# Altium footprint library COMATEL THD.PcbLib: 70 footprints (part 5 of 5)
Each footprint in its own frame and in the unit in brackets; x right, y up, seen from the top. Pads: shape width x height; smd on the part's side, far side on the other; paste and mask are expansions set on the pad; w line width, h text height; cw(c..) or ccw(c..) is an arc to the next point about the centre after c.
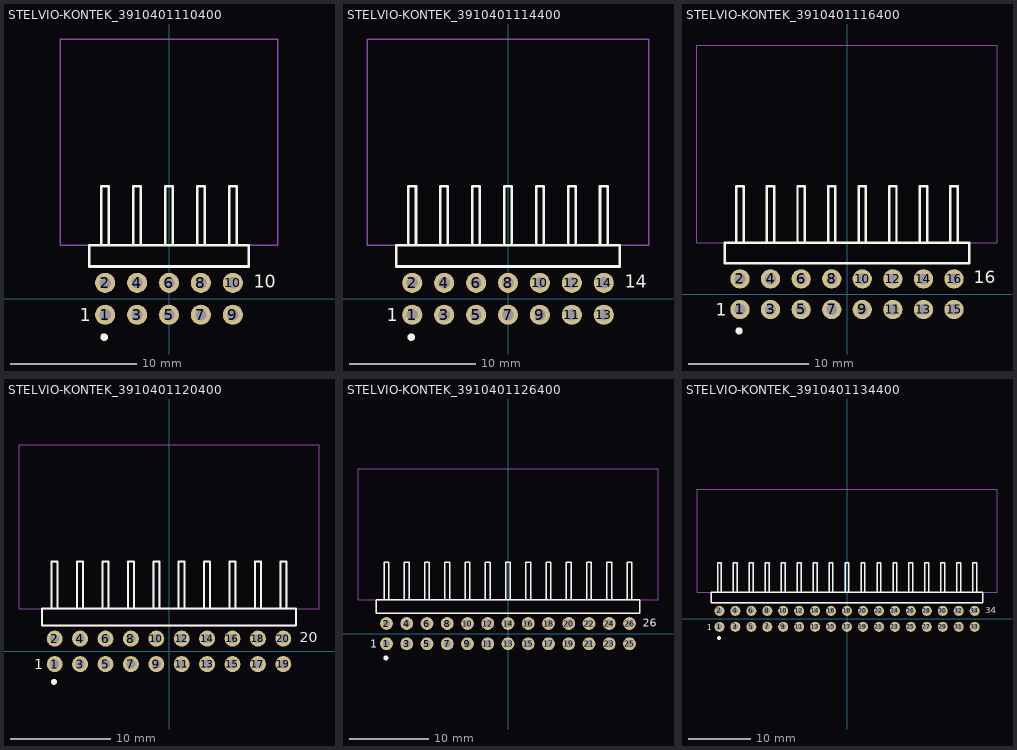
[diagram p4: the footprints below, top view; thin cyan lines are the x and y axes]

## STELVIO-KONTEK_3910401110400 [mm] "10 Contacts - Pitch 2.54mm - Dual Row Right Angle Strip Header - Insulator 1.7mm"
height 5.7
pads (10):
  round 1.6 hole 0.9: 1(-5.08,-1.27) 2(-5.08,1.27) 3(-2.54,-1.27) 4(-2.54,1.27) 5(0,-1.27) 6(0,1.27) 7(2.54,-1.27) 8(2.54,1.27) 9(5.08,-1.27) 10(5.08,1.27)
Top Overlay:
  circle w0.3: c-5.153,-3.048 r0.15
  lines w0.2: -6.35,2.57 6.35,2.57 6.35,4.27 -6.35,4.27 -6.35,2.57 ; -5.38,4.27 -5.38,8.97 -4.78,8.97 -4.78,4.27 -5.38,4.27 ; -2.84,4.27 -2.24,4.27 -2.24,8.97 -2.84,8.97 -2.84,4.27 ; -0.3,4.27 0.3,4.27 0.3,8.97 -0.3,8.97 -0.3,4.27 ; 2.24,4.27 2.84,4.27 2.84,8.97 2.24,8.97 2.24,4.27 ; 4.78,4.27 5.38,4.27 5.38,8.97 4.78,8.97 4.78,4.27
  text "1" at -7.112,-1.778 h1.02
  text "10" at 6.731,0.889 h1.02
Mechanical 8:
  lines w0.1: -8.65,4.27 -8.65,20.67 8.65,20.67 8.65,4.27 -8.65,4.27
Mechanical 14:
  lines w0.1: -6.35,2.57 -6.35,4.27 6.35,4.27 6.35,2.57 -6.35,2.57 ; -5.38,4.27 -5.38,8.97 -4.78,8.97 -4.78,4.27 -5.38,4.27 ; -2.84,4.27 -2.24,4.27 -2.24,8.97 -2.84,8.97 -2.84,4.27 ; -0.3,4.27 0.3,4.27 0.3,8.97 -0.3,8.97 -0.3,4.27 ; 2.24,4.27 2.84,4.27 2.84,8.97 2.24,8.97 2.24,4.27 ; 4.78,4.27 5.38,4.27 5.38,8.97 4.78,8.97 4.78,4.27
  text "1" at -7.112,-1.778 h1.02
  text "10" at 6.731,0.889 h1.02
3D body "STELVIO-KONTEK_3910401110400.stp": height 5.57, standoff -4.3, extent -6.35,-1.57 6.35,10.27

## STELVIO-KONTEK_3910401114400 [mm] "14 Contacts - Pitch 2.54mm - Dual Row Right Angle Strip Header - Insulator 1.7mm"
height 5.7
pads (14):
  round 1.6 hole 0.9: 1(-7.62,-1.27) 2(-7.62,1.27) 3(-5.08,-1.27) 4(-5.08,1.27) 5(-2.54,-1.27) 6(-2.54,1.27) 7(0,-1.27) 8(0,1.27) 9(2.54,-1.27) 10(2.54,1.27) 11(5.08,-1.27) 12(5.08,1.27) 13(7.62,-1.27) 14(7.62,1.27)
Top Overlay:
  circle w0.3: c-7.693,-3.048 r0.15
  lines w0.2: -7.92,4.27 -7.32,4.27 ; -7.92,4.27 -7.92,8.97 -7.32,8.97 -7.32,4.27 ; -7.92,4.27 -7.32,4.27 ; -5.38,4.27 -4.78,4.27 ; -5.38,4.27 -5.38,8.97 -4.78,8.97 -4.78,4.27 ; -5.38,4.27 -4.78,4.27 ; -2.84,4.27 -2.24,4.27 ; -2.84,4.27 -2.84,8.97 -2.24,8.97 -2.24,4.27 ; -2.84,4.27 -2.24,4.27 ; -0.3,4.27 0.3,4.27 ; -0.3,4.27 -0.3,8.97 0.3,8.97 0.3,4.27 ; -0.3,4.27 0.3,4.27 ; 2.24,4.27 2.84,4.27 ; 2.24,4.27 2.24,8.97 2.84,8.97 2.84,4.27 ; 2.24,4.27 2.84,4.27 ; -8.89,2.57 -8.89,4.27 8.89,4.27 8.89,2.57 -8.89,2.57 ; 4.78,4.27 5.38,4.27 5.38,8.97 4.78,8.97 4.78,4.27 ; 7.32,4.27 7.92,4.27 7.92,8.97 7.32,8.97 7.32,4.27
  text "14" at 9.271,0.889 h1.02
  text "1" at -9.652,-1.778 h1.02
Mechanical 8:
  lines w0.1: -11.19,4.27 11.19,4.27 11.19,20.67 -11.19,20.67 -11.19,4.27
Mechanical 14:
  lines w0.1: -7.92,4.27 -7.32,4.27 ; -7.92,4.27 -7.92,8.97 -7.32,8.97 -7.32,4.27 ; -7.92,4.27 -7.32,4.27 ; -5.38,4.27 -4.78,4.27 ; -5.38,4.27 -5.38,8.97 -4.78,8.97 -4.78,4.27 ; -5.38,4.27 -4.78,4.27 ; -2.84,4.27 -2.24,4.27 ; -2.84,4.27 -2.84,8.97 -2.24,8.97 -2.24,4.27 ; -2.84,4.27 -2.24,4.27 ; -0.3,4.27 0.3,4.27 ; -0.3,4.27 -0.3,8.97 0.3,8.97 0.3,4.27 ; -0.3,4.27 0.3,4.27 ; 2.24,4.27 2.84,4.27 ; 2.24,4.27 2.24,8.97 2.84,8.97 2.84,4.27 ; 2.24,4.27 2.84,4.27 ; -8.89,2.57 8.89,2.57 8.89,4.27 -8.89,4.27 -8.89,2.57 ; 4.78,4.27 5.38,4.27 5.38,8.97 4.78,8.97 4.78,4.27 ; 7.32,4.27 7.92,4.27 7.92,8.97 7.32,8.97 7.32,4.27
  text "14" at 9.271,0.889 h1.02
  text "1" at -9.652,-1.778 h1.02
3D body "STELVIO-KONTEK_3910401114400.stp": height 5.57, standoff -4.3, extent -8.89,-1.57 8.89,10.27

## STELVIO-KONTEK_3910401116400 [mm] "16 Contacts - Pitch 2.54mm - Dual Row Right Angle Strip Header - Insulator 1.7mm"
height 5.7
pads (16):
  round 1.6 hole 0.9: 1(-8.89,-1.27) 2(-8.89,1.27) 3(-6.35,-1.27) 4(-6.35,1.27) 5(-3.81,-1.27) 6(-3.81,1.27) 7(-1.27,-1.27) 8(-1.27,1.27) 9(1.27,-1.27) 10(1.27,1.27) 11(3.81,-1.27) 12(3.81,1.27) 13(6.35,-1.27) 14(6.35,1.27) 15(8.89,-1.27) 16(8.89,1.27)
Top Overlay:
  circle w0.3: c-8.963,-3.048 r0.15
  lines w0.2: -9.19,4.27 -8.59,4.27 ; -9.19,4.27 -9.19,8.97 -8.59,8.97 -8.59,4.27 ; -9.19,4.27 -8.59,4.27 ; -6.65,4.27 -6.05,4.27 ; -6.65,4.27 -6.65,8.97 -6.05,8.97 -6.05,4.27 ; -6.65,4.27 -6.05,4.27 ; -4.11,4.27 -3.51,4.27 ; -4.11,4.27 -4.11,8.97 -3.51,8.97 -3.51,4.27 ; -4.11,4.27 -3.51,4.27 ; -1.57,4.27 -0.97,4.27 ; -1.57,4.27 -1.57,8.97 -0.97,8.97 -0.97,4.27 ; -1.57,4.27 -0.97,4.27 ; 0.97,4.27 1.57,4.27 ; 0.97,4.27 0.97,8.97 1.57,8.97 1.57,4.27 ; 0.97,4.27 1.57,4.27 ; -10.16,2.57 -10.16,4.27 10.16,4.27 10.16,2.57 -10.16,2.57 ; 3.51,4.27 4.11,4.27 4.11,8.97 3.51,8.97 3.51,4.27 ; 6.05,4.27 6.65,4.27 6.65,8.97 6.05,8.97 6.05,4.27 ; 8.59,4.27 8.59,8.97 9.19,8.97 9.19,4.27 8.59,4.27
  text "16" at 10.541,0.889 h1.02
  text "1" at -10.922,-1.778 h1.02
Mechanical 8:
  lines w0.1: -12.46,4.27 -12.46,20.67 12.46,20.67 12.46,4.27 -12.46,4.27
Mechanical 14:
  lines w0.1: -9.19,4.27 -8.59,4.27 ; -9.19,4.27 -9.19,8.97 -8.59,8.97 -8.59,4.27 ; -9.19,4.27 -8.59,4.27 ; -6.65,4.27 -6.05,4.27 ; -6.65,4.27 -6.65,8.97 -6.05,8.97 -6.05,4.27 ; -6.65,4.27 -6.05,4.27 ; -4.11,4.27 -3.51,4.27 ; -4.11,4.27 -4.11,8.97 -3.51,8.97 -3.51,4.27 ; -4.11,4.27 -3.51,4.27 ; -1.57,4.27 -0.97,4.27 ; -1.57,4.27 -1.57,8.97 -0.97,8.97 -0.97,4.27 ; -1.57,4.27 -0.97,4.27 ; 0.97,4.27 1.57,4.27 ; 0.97,4.27 0.97,8.97 1.57,8.97 1.57,4.27 ; 0.97,4.27 1.57,4.27 ; -10.16,2.57 10.16,2.57 10.16,4.27 -10.16,4.27 -10.16,2.57 ; 3.51,4.27 4.11,4.27 4.11,8.97 3.51,8.97 3.51,4.27 ; 6.05,4.27 6.65,4.27 6.65,8.97 6.05,8.97 6.05,4.27 ; 8.59,4.27 8.59,8.97 9.19,8.97 9.19,4.27 8.59,4.27
  text "16" at 10.541,0.889 h1.02
  text "1" at -10.922,-1.778 h1.02
3D body "STELVIO-KONTEK_3910401116400.stp": height 5.57, standoff -4.3, extent -10.16,-1.57 10.16,10.27

## STELVIO-KONTEK_3910401120400 [mm] "20 Contacts - Pitch 2.54mm - Dual Row Right Angle Strip Header - Insulator 1.7mm"
height 5.7
pads (20):
  round 1.6 hole 0.9: 1(-11.43,-1.27) 2(-11.43,1.27) 3(-8.89,-1.27) 4(-8.89,1.27) 5(-6.35,-1.27) 6(-6.35,1.27) 7(-3.81,-1.27) 8(-3.81,1.27) 9(-1.27,-1.27) 10(-1.27,1.27) 11(1.27,-1.27) 12(1.27,1.27) 13(3.81,-1.27) 14(3.81,1.27) 15(6.35,-1.27) 16(6.35,1.27) 17(8.89,-1.27) 18(8.89,1.27) 19(11.43,-1.27) 20(11.43,1.27)
Top Overlay:
  circle w0.3: c-11.503,-3.048 r0.15
  lines w0.2: -11.73,4.27 -11.13,4.27 ; -11.73,4.27 -11.73,8.97 -11.13,8.97 -11.13,4.27 ; -11.73,4.27 -11.13,4.27 ; -9.19,4.27 -8.59,4.27 ; -9.19,4.27 -9.19,8.97 -8.59,8.97 -8.59,4.27 ; -9.19,4.27 -8.59,4.27 ; -6.65,4.27 -6.05,4.27 ; -6.65,4.27 -6.65,8.97 -6.05,8.97 -6.05,4.27 ; -6.65,4.27 -6.05,4.27 ; -4.11,4.27 -3.51,4.27 ; -4.11,4.27 -4.11,8.97 -3.51,8.97 -3.51,4.27 ; -4.11,4.27 -3.51,4.27 ; -1.57,4.27 -0.97,4.27 ; -1.57,4.27 -1.57,8.97 -0.97,8.97 -0.97,4.27 ; -1.57,4.27 -0.97,4.27 ; 0.97,4.27 1.57,4.27 ; 0.97,4.27 0.97,8.97 1.57,8.97 1.57,4.27 ; 0.97,4.27 1.57,4.27 ; 3.51,4.27 4.11,4.27 ; 3.51,4.27 3.51,8.97 4.11,8.97 4.11,4.27 ; 3.51,4.27 4.11,4.27 ; 6.05,4.27 6.65,4.27 ; 6.05,4.27 6.05,8.97 6.65,8.97 6.65,4.27 ; 6.05,4.27 6.65,4.27 ; 8.59,4.27 9.19,4.27 ; 8.59,4.27 8.59,8.97 9.19,8.97 9.19,4.27 ; 8.59,4.27 9.19,4.27 ; 11.13,4.27 11.73,4.27 ; 11.13,4.27 11.13,8.97 11.73,8.97 11.73,4.27 ; 11.13,4.27 11.73,4.27 ; -12.7,2.57 -12.7,4.27 12.7,4.27 12.7,2.57 -12.7,2.57
  text "1" at -13.462,-1.778 h1.02
  text "20" at 13.081,0.889 h1.02
Mechanical 8:
  lines w0.1: -15,4.27 -15,20.67 15,20.67 15,4.27 -15,4.27
Mechanical 14:
  lines w0.1: -11.73,4.27 -11.13,4.27 ; -11.73,4.27 -11.73,8.97 -11.13,8.97 -11.13,4.27 ; -11.73,4.27 -11.13,4.27 ; -9.19,4.27 -8.59,4.27 ; -9.19,4.27 -9.19,8.97 -8.59,8.97 -8.59,4.27 ; -9.19,4.27 -8.59,4.27 ; -6.65,4.27 -6.05,4.27 ; -6.65,4.27 -6.65,8.97 -6.05,8.97 -6.05,4.27 ; -6.65,4.27 -6.05,4.27 ; -4.11,4.27 -3.51,4.27 ; -4.11,4.27 -4.11,8.97 -3.51,8.97 -3.51,4.27 ; -4.11,4.27 -3.51,4.27 ; -1.57,4.27 -0.97,4.27 ; -1.57,4.27 -1.57,8.97 -0.97,8.97 -0.97,4.27 ; -1.57,4.27 -0.97,4.27 ; 0.97,4.27 1.57,4.27 ; 0.97,4.27 0.97,8.97 1.57,8.97 1.57,4.27 ; 0.97,4.27 1.57,4.27 ; 3.51,4.27 4.11,4.27 ; 3.51,4.27 3.51,8.97 4.11,8.97 4.11,4.27 ; 3.51,4.27 4.11,4.27 ; 6.05,4.27 6.65,4.27 ; 6.05,4.27 6.05,8.97 6.65,8.97 6.65,4.27 ; 6.05,4.27 6.65,4.27 ; 8.59,4.27 9.19,4.27 ; 8.59,4.27 8.59,8.97 9.19,8.97 9.19,4.27 ; 8.59,4.27 9.19,4.27 ; 11.13,4.27 11.73,4.27 ; 11.13,4.27 11.13,8.97 11.73,8.97 11.73,4.27 ; 11.13,4.27 11.73,4.27 ; -12.7,2.57 12.7,2.57 12.7,4.27 -12.7,4.27 -12.7,2.57
  text "1" at -13.462,-1.778 h1.02
  text "20" at 13.081,0.889 h1.02
3D body "STELVIO-KONTEK_3910401120400.stp": height 5.57, standoff -4.3, extent -12.7,-1.57 12.7,10.27

## STELVIO-KONTEK_3910401126400 [mm] "26 Contacts - Pitch 2.54mm - Dual Row Right Angle Strip Header - Insulator 1.7mm"
height 5.7
pads (26):
  round 1.6 hole 0.9: 1(-15.24,-1.27) 2(-15.24,1.27) 3(-12.7,-1.27) 4(-12.7,1.27) 5(-10.16,-1.27) 6(-10.16,1.27) 7(-7.62,-1.27) 8(-7.62,1.27) 9(-5.08,-1.27) 10(-5.08,1.27) 11(-2.54,-1.27) 12(-2.54,1.27) 13(0,-1.27) 14(0,1.27) 15(2.54,-1.27) 16(2.54,1.27) 17(5.08,-1.27) 18(5.08,1.27) 19(7.62,-1.27) 20(7.62,1.27) 21(10.16,-1.27) 22(10.16,1.27) 23(12.7,-1.27) 24(12.7,1.27) 25(15.24,-1.27) 26(15.24,1.27)
Top Overlay:
  circle w0.3: c-15.313,-3.048 r0.15
  lines w0.2: -15.54,4.27 -14.94,4.27 ; -15.54,4.27 -15.54,8.97 -14.94,8.97 -14.94,4.27 ; -15.54,4.27 -14.94,4.27 ; -13,4.27 -12.4,4.27 ; -13,4.27 -13,8.97 -12.4,8.97 -12.4,4.27 ; -13,4.27 -12.4,4.27 ; -10.46,4.27 -9.86,4.27 ; -10.46,4.27 -10.46,8.97 -9.86,8.97 -9.86,4.27 ; -10.46,4.27 -9.86,4.27 ; -7.92,4.27 -7.32,4.27 ; -7.92,4.27 -7.92,8.97 -7.32,8.97 -7.32,4.27 ; -7.92,4.27 -7.32,4.27 ; -5.38,4.27 -4.78,4.27 ; -5.38,4.27 -5.38,8.97 -4.78,8.97 -4.78,4.27 ; -5.38,4.27 -4.78,4.27 ; -2.84,4.27 -2.24,4.27 ; -2.84,4.27 -2.84,8.97 -2.24,8.97 -2.24,4.27 ; -2.84,4.27 -2.24,4.27 ; -0.3,4.27 0.3,4.27 ; -0.3,4.27 -0.3,8.97 0.3,8.97 0.3,4.27 ; -0.3,4.27 0.3,4.27 ; 2.24,4.27 2.84,4.27 ; 2.24,4.27 2.24,8.97 2.84,8.97 2.84,4.27 ; 2.24,4.27 2.84,4.27 ; 4.78,4.27 5.38,4.27 ; 4.78,4.27 4.78,8.97 5.38,8.97 5.38,4.27 ; 4.78,4.27 5.38,4.27 ; 7.32,4.27 7.92,4.27 ; 7.32,4.27 7.32,8.97 7.92,8.97 7.92,4.27 ; 7.32,4.27 7.92,4.27 ; 9.86,4.27 10.46,4.27 ; 9.86,4.27 9.86,8.97 10.46,8.97 10.46,4.27 ; 9.86,4.27 10.46,4.27 ; 12.4,4.27 13,4.27 ; 12.4,4.27 12.4,8.97 13,8.97 13,4.27 ; 12.4,4.27 13,4.27 ; 14.94,4.27 15.54,4.27 ; 14.94,4.27 14.94,8.97 15.54,8.97 15.54,4.27 ; 14.94,4.27 15.54,4.27 ; -16.51,2.57 16.51,2.57 16.51,4.27 -16.51,4.27 -16.51,2.57
  text "26" at 16.891,0.889 h1.02
  text "1" at -17.272,-1.778 h1.02
Mechanical 8:
  lines w0.1: -18.81,4.27 18.81,4.27 18.81,20.67 -18.81,20.67 -18.81,4.27
Mechanical 14:
  lines w0.1: -15.54,4.27 -14.94,4.27 ; -15.54,4.27 -15.54,8.97 -14.94,8.97 -14.94,4.27 ; -15.54,4.27 -14.94,4.27 ; -13,4.27 -12.4,4.27 ; -13,4.27 -13,8.97 -12.4,8.97 -12.4,4.27 ; -13,4.27 -12.4,4.27 ; -10.46,4.27 -9.86,4.27 ; -10.46,4.27 -10.46,8.97 -9.86,8.97 -9.86,4.27 ; -10.46,4.27 -9.86,4.27 ; -7.92,4.27 -7.32,4.27 ; -7.92,4.27 -7.92,8.97 -7.32,8.97 -7.32,4.27 ; -7.92,4.27 -7.32,4.27 ; -5.38,4.27 -4.78,4.27 ; -5.38,4.27 -5.38,8.97 -4.78,8.97 -4.78,4.27 ; -5.38,4.27 -4.78,4.27 ; -2.84,4.27 -2.24,4.27 ; -2.84,4.27 -2.84,8.97 -2.24,8.97 -2.24,4.27 ; -2.84,4.27 -2.24,4.27 ; -0.3,4.27 0.3,4.27 ; -0.3,4.27 -0.3,8.97 0.3,8.97 0.3,4.27 ; -0.3,4.27 0.3,4.27 ; 2.24,4.27 2.84,4.27 ; 2.24,4.27 2.24,8.97 2.84,8.97 2.84,4.27 ; 2.24,4.27 2.84,4.27 ; 4.78,4.27 5.38,4.27 ; 4.78,4.27 4.78,8.97 5.38,8.97 5.38,4.27 ; 4.78,4.27 5.38,4.27 ; 7.32,4.27 7.92,4.27 ; 7.32,4.27 7.32,8.97 7.92,8.97 7.92,4.27 ; 7.32,4.27 7.92,4.27 ; 9.86,4.27 10.46,4.27 ; 9.86,4.27 9.86,8.97 10.46,8.97 10.46,4.27 ; 9.86,4.27 10.46,4.27 ; 12.4,4.27 13,4.27 ; 12.4,4.27 12.4,8.97 13,8.97 13,4.27 ; 12.4,4.27 13,4.27 ; 14.94,4.27 15.54,4.27 ; 14.94,4.27 14.94,8.97 15.54,8.97 15.54,4.27 ; 14.94,4.27 15.54,4.27 ; -16.51,2.57 -16.51,4.27 16.51,4.27 16.51,2.57 -16.51,2.57
  text "26" at 16.891,0.889 h1.02
  text "1" at -17.272,-1.778 h1.02
3D body "STELVIO-KONTEK_3910401126400.stp": height 5.57, standoff -4.3, extent -16.51,-1.57 16.51,10.27

## STELVIO-KONTEK_3910401134400 [mm] "34 Contacts - Pitch 2.54mm - Dual Row Right Angle Strip Header - Insulator 1.7mm"
height 5.7
pads (34):
  round 1.6 hole 0.9: 1(-20.32,-1.27) 2(-20.32,1.27) 3(-17.78,-1.27) 4(-17.78,1.27) 5(-15.24,-1.27) 6(-15.24,1.27) 7(-12.7,-1.27) 8(-12.7,1.27) 9(-10.16,-1.27) 10(-10.16,1.27) 11(-7.62,-1.27) 12(-7.62,1.27) 13(-5.08,-1.27) 14(-5.08,1.27) 15(-2.54,-1.27) 16(-2.54,1.27) 17(0,-1.27) 18(0,1.27) 19(2.54,-1.27) 20(2.54,1.27) 21(5.08,-1.27) 22(5.08,1.27) 23(7.62,-1.27) 24(7.62,1.27) 25(10.16,-1.27) 26(10.16,1.27) 27(12.7,-1.27) 28(12.7,1.27) 29(15.24,-1.27) 30(15.24,1.27) 31(17.78,-1.27) 32(17.78,1.27) 33(20.32,-1.27) 34(20.32,1.27)
Top Overlay:
  circle w0.3: c-20.393,-3.048 r0.15
  lines w0.2: -20.62,4.27 -20.02,4.27 ; -20.62,4.27 -20.02,4.27 ; -20.62,4.27 -20.02,4.27 ; -20.62,4.27 -20.62,8.97 -20.02,8.97 -20.02,4.27 ; -20.62,4.27 -20.02,4.27 ; -18.08,4.27 -17.48,4.27 ; -18.08,4.27 -17.48,4.27 ; -18.08,4.27 -17.48,4.27 ; -18.08,4.27 -18.08,8.97 -17.48,8.97 -17.48,4.27 ; -18.08,4.27 -17.48,4.27 ; -15.54,4.27 -14.94,4.27 ; -15.54,4.27 -14.94,4.27 ; -15.54,4.27 -14.94,4.27 ; -15.54,4.27 -15.54,8.97 -14.94,8.97 -14.94,4.27 ; -15.54,4.27 -14.94,4.27 ; -13,4.27 -12.4,4.27 ; -13,4.27 -12.4,4.27 ; -13,4.27 -12.4,4.27 ; -13,4.27 -13,8.97 -12.4,8.97 -12.4,4.27 ; -13,4.27 -12.4,4.27 ; -10.46,4.27 -9.86,4.27 ; -10.46,4.27 -9.86,4.27 ; -10.46,4.27 -9.86,4.27 ; -10.46,4.27 -10.46,8.97 -9.86,8.97 -9.86,4.27 ; -10.46,4.27 -9.86,4.27 ; -7.92,4.27 -7.32,4.27 ; -7.92,4.27 -7.32,4.27 ; -7.92,4.27 -7.32,4.27 ; -7.92,4.27 -7.92,8.97 -7.32,8.97 -7.32,4.27 ; -7.92,4.27 -7.32,4.27 ; -5.38,4.27 -4.78,4.27 ; -5.38,4.27 -4.78,4.27 ; -5.38,4.27 -4.78,4.27 ; -5.38,4.27 -5.38,8.97 -4.78,8.97 -4.78,4.27 ; -5.38,4.27 -4.78,4.27 ; -2.84,4.27 -2.24,4.27 ; -2.84,4.27 -2.24,4.27 ; -2.84,4.27 -2.24,4.27 ; -2.84,4.27 -2.84,8.97 -2.24,8.97 -2.24,4.27 ; -2.84,4.27 -2.24,4.27 ; -0.3,4.27 0.3,4.27 ; -0.3,4.27 0.3,4.27 ; -0.3,4.27 0.3,4.27 ; -0.3,4.27 -0.3,8.97 0.3,8.97 0.3,4.27 ; -0.3,4.27 0.3,4.27 ; 2.24,4.27 2.84,4.27 ; 2.24,4.27 2.84,4.27 ; 2.24,4.27 2.84,4.27 ; 2.24,4.27 2.24,8.97 2.84,8.97 2.84,4.27 ; 2.24,4.27 2.84,4.27 ; 4.78,4.27 5.38,4.27 ; 4.78,4.27 5.38,4.27 ; 4.78,4.27 5.38,4.27 ; 4.78,4.27 4.78,8.97 5.38,8.97 5.38,4.27 ; 4.78,4.27 5.38,4.27 ; 7.32,4.27 7.92,4.27 ; 7.32,4.27 7.92,4.27 ; 7.32,4.27 7.92,4.27 ; 7.32,4.27 7.32,8.97 7.92,8.97 7.92,4.27 ; 7.32,4.27 7.92,4.27 ; 9.86,4.27 10.46,4.27 ; 9.86,4.27 10.46,4.27 ; 9.86,4.27 10.46,4.27 ; 9.86,4.27 9.86,8.97 10.46,8.97 10.46,4.27 ; 9.86,4.27 10.46,4.27 ; 12.4,4.27 13,4.27 ; 12.4,4.27 12.4,8.97 13,8.97 13,4.27 ; 12.4,4.27 13,4.27 ; 14.94,4.27 15.54,4.27 ; 14.94,4.27 14.94,8.97 15.54,8.97 15.54,4.27 ; 14.94,4.27 15.54,4.27 ; 17.48,4.27 18.08,4.27 ; 17.48,4.27 17.48,8.97 18.08,8.97 18.08,4.27 ; 17.48,4.27 18.08,4.27 ; 20.02,4.27 20.62,4.27 ; 20.02,4.27 20.02,8.97 20.62,8.97 20.62,4.27 ; 20.02,4.27 20.62,4.27 ; -21.59,2.57 21.59,2.57 21.59,4.27 -21.59,4.27 -21.59,2.57
  text "1" at -22.352,-1.778 h1.02
  text "34" at 21.971,0.889 h1.02
Mechanical 8:
  lines w0.1: -23.89,4.27 -23.89,20.67 23.88,20.67 23.88,4.27 -23.89,4.27
Mechanical 14:
  lines w0.1: -20.62,4.27 -20.02,4.27 ; -20.62,4.27 -20.02,4.27 ; -20.62,4.27 -20.02,4.27 ; -20.62,4.27 -20.62,8.97 -20.02,8.97 -20.02,4.27 ; -20.62,4.27 -20.02,4.27 ; -18.08,4.27 -17.48,4.27 ; -18.08,4.27 -17.48,4.27 ; -18.08,4.27 -17.48,4.27 ; -18.08,4.27 -18.08,8.97 -17.48,8.97 -17.48,4.27 ; -18.08,4.27 -17.48,4.27 ; -15.54,4.27 -14.94,4.27 ; -15.54,4.27 -14.94,4.27 ; -15.54,4.27 -14.94,4.27 ; -15.54,4.27 -15.54,8.97 -14.94,8.97 -14.94,4.27 ; -15.54,4.27 -14.94,4.27 ; -13,4.27 -12.4,4.27 ; -13,4.27 -12.4,4.27 ; -13,4.27 -12.4,4.27 ; -13,4.27 -13,8.97 -12.4,8.97 -12.4,4.27 ; -13,4.27 -12.4,4.27 ; -10.46,4.27 -9.86,4.27 ; -10.46,4.27 -9.86,4.27 ; -10.46,4.27 -9.86,4.27 ; -10.46,4.27 -10.46,8.97 -9.86,8.97 -9.86,4.27 ; -10.46,4.27 -9.86,4.27 ; -7.92,4.27 -7.32,4.27 ; -7.92,4.27 -7.32,4.27 ; -7.92,4.27 -7.32,4.27 ; -7.92,4.27 -7.92,8.97 -7.32,8.97 -7.32,4.27 ; -7.92,4.27 -7.32,4.27 ; -5.38,4.27 -4.78,4.27 ; -5.38,4.27 -4.78,4.27 ; -5.38,4.27 -4.78,4.27 ; -5.38,4.27 -5.38,8.97 -4.78,8.97 -4.78,4.27 ; -5.38,4.27 -4.78,4.27 ; -2.84,4.27 -2.24,4.27 ; -2.84,4.27 -2.24,4.27 ; -2.84,4.27 -2.24,4.27 ; -2.84,4.27 -2.84,8.97 -2.24,8.97 -2.24,4.27 ; -2.84,4.27 -2.24,4.27 ; -0.3,4.27 0.3,4.27 ; -0.3,4.27 0.3,4.27 ; -0.3,4.27 0.3,4.27 ; -0.3,4.27 -0.3,8.97 0.3,8.97 0.3,4.27 ; -0.3,4.27 0.3,4.27 ; 2.24,4.27 2.84,4.27 ; 2.24,4.27 2.84,4.27 ; 2.24,4.27 2.84,4.27 ; 2.24,4.27 2.24,8.97 2.84,8.97 2.84,4.27 ; 2.24,4.27 2.84,4.27 ; 4.78,4.27 5.38,4.27 ; 4.78,4.27 5.38,4.27 ; 4.78,4.27 5.38,4.27 ; 4.78,4.27 4.78,8.97 5.38,8.97 5.38,4.27 ; 4.78,4.27 5.38,4.27 ; 7.32,4.27 7.92,4.27 ; 7.32,4.27 7.92,4.27 ; 7.32,4.27 7.92,4.27 ; 7.32,4.27 7.32,8.97 7.92,8.97 7.92,4.27 ; 7.32,4.27 7.92,4.27 ; 9.86,4.27 10.46,4.27 ; 9.86,4.27 10.46,4.27 ; 9.86,4.27 10.46,4.27 ; 9.86,4.27 9.86,8.97 10.46,8.97 10.46,4.27 ; 9.86,4.27 10.46,4.27 ; 12.4,4.27 13,4.27 ; 12.4,4.27 12.4,8.97 13,8.97 13,4.27 ; 12.4,4.27 13,4.27 ; 14.94,4.27 15.54,4.27 ; 14.94,4.27 14.94,8.97 15.54,8.97 15.54,4.27 ; 14.94,4.27 15.54,4.27 ; 17.48,4.27 18.08,4.27 ; 17.48,4.27 17.48,8.97 18.08,8.97 18.08,4.27 ; 17.48,4.27 18.08,4.27 ; 20.02,4.27 20.62,4.27 ; 20.02,4.27 20.02,8.97 20.62,8.97 20.62,4.27 ; 20.02,4.27 20.62,4.27 ; -21.59,2.57 -21.59,4.27 21.59,4.27 21.59,2.57 -21.59,2.57
  text "1" at -22.352,-1.778 h1.02
  text "34" at 21.971,0.889 h1.02
3D body "STELVIO-KONTEK_3910401134400.stp": height 5.57, standoff -4.3, extent -21.59,-1.57 21.59,10.27